# Altium footprint library LimeMicroAltiumLib_pcbLib_r01.PcbLib: 434 footprints (part 11 of 29)
Each footprint in its own frame and in the unit in brackets; x right, y up, seen from the top. Pads: shape width x height; smd on the part's side, far side on the other; paste and mask are expansions set on the pad; w line width, h text height; cw(c..) or ccw(c..) is an arc to the next point about the centre after c.
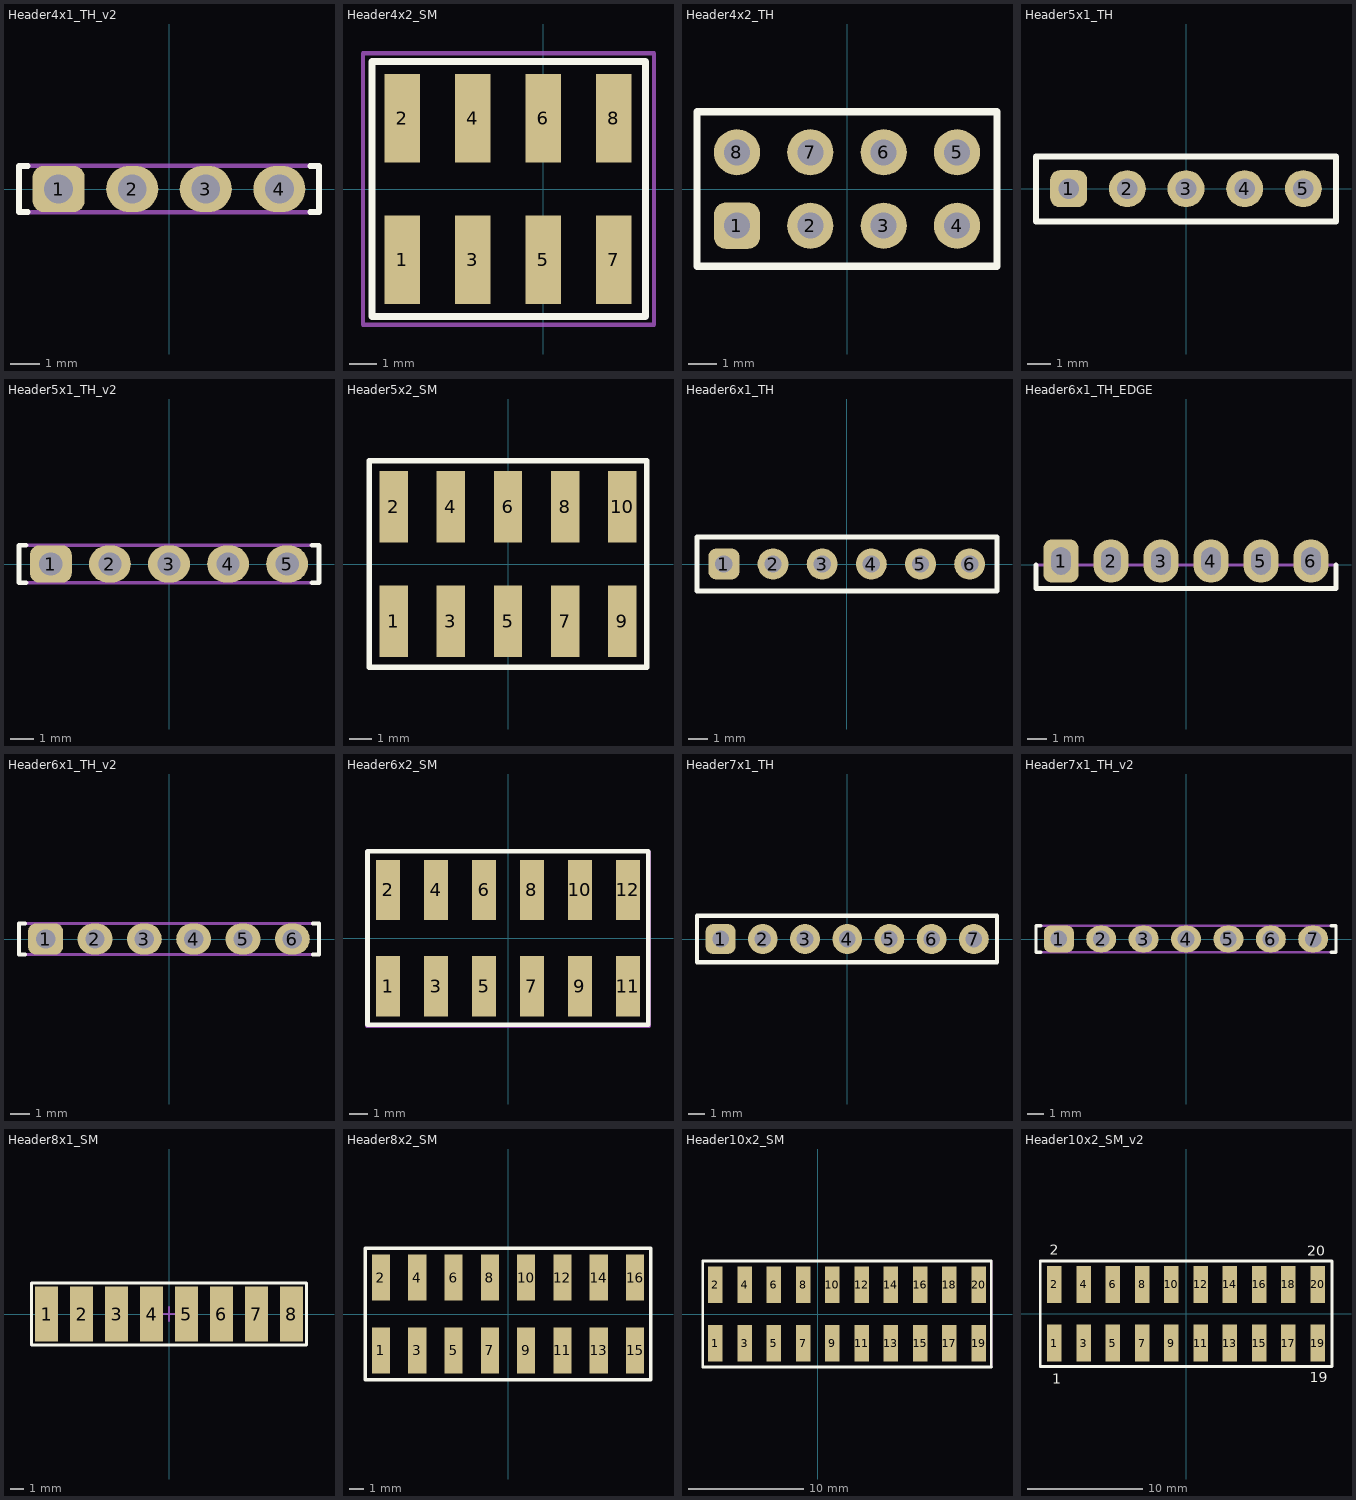
[diagram p10: the footprints below, top view; thin cyan lines are the x and y axes]

## Header4x1_TH_v2 [mm]
pads (4):
  rrect50% 1.8x1.6 hole 1: 1(-3.814,0)
  oval 1.8x1.6 hole 1: 2(-1.271,0) 3(1.271,0) 4(3.814,0)
Top Overlay:
  lines w0.2: -4.886,-0.8 -5.186,-0.8 -5.186,0.8 -4.886,0.8 ; 4.886,-0.8 5.186,-0.8 5.186,0.8 4.886,0.8
Mechanical 15:
  lines w0.15: -5.186,-0.8 -5.186,0.8 5.186,0.8 5.186,-0.8 -5.186,-0.8
  text ".Designator" at -0.025,0 h0.55

## Header4x2_SM [mm]
pads (8):
  rect 1.27x3.2 smd: 1(-5.086,-2.55) 2(-5.086,2.55) 3(-2.543,-2.55) 4(-2.543,2.55) 5(0,-2.55) 6(0,2.55) 7(2.543,-2.55) 8(2.543,2.55)
Top Overlay:
  lines w0.254: -6.186,-4.6 3.7,-4.6 3.7,4.6 -6.186,4.6 -6.186,-4.6
Mechanical 15:
  lines w0.15: -6.5,-4.9 4,-4.9 4,4.9 -6.5,4.9 -6.5,-4.9
  text ".Designator" at -1.4,-0.1 h0.55
3D body "pin_header_a-sl254-dg-g08mp1.stp": height 9.7, standoff -0.04, extent -6.38,-3.75 3.78,3.75

## Header4x2_TH [mm]
pads (8):
  rrect50% 1.6x1.6 hole 0.9: 1(-3.814,-1.271)
  round 1.6 hole 0.9: 2(-1.271,-1.271) 3(1.271,-1.271) 4(3.814,-1.271) 5(3.814,1.271) 6(1.271,1.271) 7(-1.271,1.271) 8(-3.814,1.271)
Top Overlay:
  lines w0.254: -5.2,-2.675 -5.2,2.675 5.2,2.675 5.2,-2.675 -5.2,-2.675
Mechanical 15:
  lines w0.15: -5.2,-2.675 5.2,-2.675 5.2,2.675 -5.2,2.675 -5.2,-2.675
  text ".Designator" at 0,0 h0.55
3D body "65775.stp": height 8.54, standoff -3, extent -5.084,-2.541 -2.544,-0.001
3D body "65775.stp": height 8.54, standoff -3, extent -2.541,-2.541 -0.001,-0.001
3D body "65775.stp": height 8.54, standoff -3, extent 0.001,-2.541 2.541,-0.001
3D body "65775.stp": height 8.54, standoff -3, extent 2.544,-2.541 5.084,-0.001
3D body "65775.stp": height 8.54, standoff -3, extent 2.544,0.002 5.084,2.542
3D body "65775.stp": height 8.54, standoff -3, extent 0.001,0.002 2.541,2.542
3D body "65775.stp": height 8.54, standoff -3, extent -2.541,0.002 -0.001,2.542
3D body "65775.stp": height 8.54, standoff -3, extent -5.084,0.002 -2.544,2.542

## Header5x1_TH [mm]
pads (5):
  rrect50% 1.6x1.6 hole 0.9: 1(-5.086,0)
  round 1.6 hole 0.9: 2(-2.543,0) 3(0,0) 4(2.543,0) 5(5.086,0)
Top Overlay:
  lines w0.254: -6.5,-1.425 -6.5,1.4 6.5,1.4 6.5,-1.425 -6.5,-1.425
Mechanical 15:
  lines w0.15: -6.5,-1.425 6.5,-1.425 6.5,1.4 -6.5,1.4 -6.5,-1.425
  text ".Designator" at 0,0 h0.55
3D body "65775.stp": height 8.54, standoff -3, extent -6.356,-1.27 -3.816,1.27
3D body "65775.stp": height 8.54, standoff -3, extent -3.813,-1.27 -1.273,1.27
3D body "65775.stp": height 8.54, standoff -3, extent -1.27,-1.27 1.27,1.27
3D body "65775.stp": height 8.54, standoff -3, extent 1.273,-1.27 3.813,1.27
3D body "65775.stp": height 8.54, standoff -3, extent 3.816,-1.27 6.356,1.27

## Header5x1_TH_v2 [mm]
pads (5):
  rrect50% 1.8x1.6 hole 1: 1(-5.086,0)
  oval 1.8x1.6 hole 1: 2(-2.543,0) 3(0,0) 4(2.543,0) 5(5.086,0)
Top Overlay:
  lines w0.2: -6.157,-0.8 -6.457,-0.8 -6.457,0.8 -6.157,0.8 ; 6.157,-0.8 6.457,-0.8 6.457,0.8 6.157,0.8
Mechanical 15:
  lines w0.15: -6.457,-0.8 6.457,-0.8 6.457,0.8 -6.457,0.8 -6.457,-0.8
  text ".Designator" at 0,0 h0.55

## Header5x2_SM [mm]
pads (10):
  rect 1.27x3.2 smd: 1(-5.086,-2.55) 2(-5.086,2.55) 3(-2.543,-2.55) 4(-2.543,2.55) 5(0,-2.55) 6(0,2.55) 7(2.543,-2.55) 8(2.543,2.55) 9(5.086,-2.55) 10(5.086,2.55)
Top Overlay:
  lines w0.254: -6.186,-4.6 6.189,-4.6 6.189,4.6 -6.186,4.6 -6.186,-4.6
Mechanical 15:
  lines w0.15: -6.2,-4.6 -6.2,4.6 6.2,4.6 6.2,-4.6 -6.2,-4.6
  text ".Designator" at 0,0 h0.55
3D body "pin_header_a-sl254-dg-g10mp1.stp": height 9.7, standoff -0.04, extent -6.35,-3.75 6.35,3.75

## Header6x1_TH [mm]
pads (6):
  rrect50% 1.6x1.6 hole 0.9: 1(-6.357,0)
  round 1.6 hole 0.9: 2(-3.814,0) 3(-1.271,0) 4(1.271,0) 5(3.814,0) 6(6.357,0)
Top Overlay:
  lines w0.254: -7.75,-1.4 7.775,-1.4 7.775,1.4 -7.75,1.4 -7.75,-1.4
Mechanical 15:
  lines w0.15: -7.75,-1.4 -7.75,1.4 7.775,1.4 7.775,-1.4 -7.75,-1.4
  text ".Designator" at -1.271,0 h0.55
3D body "65775.stp": height 8.54, standoff -3, extent 5.087,-1.27 7.627,1.27
3D body "65775.stp": height 8.54, standoff -3, extent 2.544,-1.27 5.084,1.27
3D body "65775.stp": height 8.54, standoff -3, extent 0.001,-1.27 2.541,1.27
3D body "65775.stp": height 8.54, standoff -3, extent -2.541,-1.27 -0.001,1.27
3D body "65775.stp": height 8.54, standoff -3, extent -5.084,-1.27 -2.544,1.27
3D body "65775.stp": height 8.54, standoff -3, extent -7.627,-1.27 -5.087,1.27

## Header6x1_TH_EDGE [mm]
pads (6):
  rrect50% 1.8x2.2 hole 1 slot 1.4 at 90 deg: 1(-6.357,0.2)
  oval 1.8x2.2 hole 1 slot 1.4 at 90 deg: 2(-3.814,0.2) 3(-1.271,0.2) 4(1.271,0.2) 5(3.814,0.2) 6(6.357,0.2)
Top Overlay:
  lines w0.254: -7.629,0 -7.629,-1.2 7.629,-1.2 7.629,0
Mechanical 15:
  lines w0.15: -7.629,-1.2 -7.629,0 7.629,0 7.629,-1.2 -7.629,-1.2
  text ".Designator" at 0,0 h0.55

## Header6x1_TH_v2 [mm]
pads (6):
  rrect50% 1.8x1.6 hole 1: 1(-6.357,0)
  oval 1.8x1.6 hole 1: 2(-3.814,0) 3(-1.271,0) 4(1.271,0) 5(3.814,0) 6(6.357,0)
Top Overlay:
  lines w0.2: -7.429,-0.8 -7.729,-0.8 -7.729,0.8 -7.429,0.8 ; 7.429,-0.8 7.729,-0.8 7.729,0.8 7.429,0.8
Mechanical 15:
  lines w0.15: -7.729,-0.8 -7.729,0.8 7.729,0.8 7.729,-0.8 -7.729,-0.8
  text ".Designator" at 0,0 h0.55

## Header6x2_SM [mm]
pads (12):
  rect 1.27x3.2 smd: 1(-6.357,-2.55) 2(-6.357,2.55) 3(-3.814,-2.55) 4(-3.814,2.55) 5(-1.271,-2.55) 6(-1.271,2.55) 7(1.271,-2.55) 8(1.271,2.55) 9(3.814,-2.55) 10(3.814,2.55) 11(6.357,-2.55) 12(6.357,2.55)
Top Overlay:
  lines w0.254: -7.457,-4.6 7.443,-4.6 7.443,4.6 -7.457,4.6 -7.457,-4.6
Mechanical 15:
  lines w0.15: -7.5,-4.7 -7.5,4.6 7.5,4.6 7.5,-4.7 -7.5,-4.7
  text ".Designator" at 0,0 h0.55
3D body "pin_header_a-sl254-dg-g12mp1.stp": height 9.7, standoff -0.04, extent -7.62,-3.75 7.62,3.75

## Header7x1_TH [mm]
pads (7):
  rrect50% 1.8x1.8 hole 1: 1(-7.629,0)
  round 1.8 hole 1: 2(-5.086,0) 3(-2.543,0) 4(0,0) 5(2.543,0) 6(5.086,0) 7(7.629,0)
Top Overlay:
  lines w0.254: -9.05,-1.4 9.025,-1.4 9.025,1.4 -9.05,1.4 -9.05,-1.4
Mechanical 15:
  lines w0.15: -9.05,-1.4 -9.05,1.4 9.025,1.4 9.025,-1.4 -9.05,-1.4
  text ".Designator" at 0,0 h0.55
3D body "65775.stp": height 8.54, standoff -3, extent -8.899,-1.27 -6.359,1.27
3D body "65775.stp": height 8.54, standoff -3, extent -6.356,-1.27 -3.816,1.27
3D body "65775.stp": height 8.54, standoff -3, extent -3.813,-1.27 -1.273,1.27
3D body "65775.stp": height 8.54, standoff -3, extent -1.27,-1.27 1.27,1.27
3D body "65775.stp": height 8.54, standoff -3, extent 1.273,-1.27 3.813,1.27
3D body "65775.stp": height 8.54, standoff -3, extent 3.816,-1.27 6.356,1.27
3D body "65775.stp": height 8.54, standoff -3, extent 6.359,-1.27 8.899,1.27

## Header7x1_TH_v2 [mm]
pads (7):
  rrect50% 1.8x1.6 hole 1: 1(-7.629,0)
  oval 1.8x1.6 hole 1: 2(-5.086,0) 3(-2.543,0) 4(0,0) 5(2.543,0) 6(5.086,0) 7(7.629,0)
Top Overlay:
  lines w0.2: -8.7,-0.8 -9,-0.8 -9,0.8 -8.7,0.8 ; 8.7,-0.8 9,-0.8 9,0.8 8.7,0.8
Mechanical 15:
  lines w0.15: -9,-0.8 9,-0.8 9,0.8 -9,0.8 -9,-0.8
  text ".Designator" at 0,0 h0.55

## Header8x1_SM [mm]
pads (8):
  rect 1.7x4 smd: 1(-8.9,0) 2(-6.357,0) 3(-3.814,0) 4(-1.271,0) 5(1.271,0) 6(3.814,0) 7(6.357,0) 8(8.9,0)
Top Overlay:
  lines w0.2: -10,-2.25 -10,2.25 10,2.25 10,-2.25 -10,-2.25
Mechanical 15:
  lines w0.15: -0.5,0 0,0 ; 0,-0.5 0,0 ; 0,0.5 0,0 ; 0.5,0 0,0 ; -10.014,-2.25 10,-2.25 10,2.25 -10.014,2.25 -10.014,-2.25
  text ".Designator" at 0,0 h0.55

## Header8x2_SM [mm]
pads (16):
  rect 1.27x3.2 smd: 1(-8.9,-2.55) 2(-8.9,2.55) 3(-6.357,-2.55) 4(-6.357,2.55) 5(-3.814,-2.55) 6(-3.814,2.55) 7(-1.271,-2.55) 8(-1.271,2.55) 9(1.271,-2.55) 10(1.271,2.55) 11(3.814,-2.55) 12(3.814,2.55) 13(6.357,-2.55) 14(6.357,2.55) 15(8.9,-2.55) 16(8.9,2.55)
Top Overlay:
  lines w0.254: -10,-4.6 10,-4.6 10,4.6 -10,4.6 -10,-4.6
Mechanical 15:
  lines w0.15: -10,-4.6 -10,4.6 10,4.6 10,-4.6 -10,-4.6
  text ".Designator" at 0,0 h0.55
3D body "pin_header_a-sl254-dg-g08mp1.stp": height 9.7, standoff -0.04, extent -10.18,-3.95 -0.02,3.55
3D body "pin_header_a-sl254-dg-g08mp1.stp": height 9.7, standoff -0.04, extent -0.02,-3.95 10.14,3.55

## Header10x2_SM [mm] "JTAG"
pads (20):
  rect 1.27x3.2 smd: 1(-8.9,-2.55) 2(-8.9,2.55) 3(-6.357,-2.55) 4(-6.357,2.55) 5(-3.814,-2.55) 6(-3.814,2.55) 7(-1.271,-2.55) 8(-1.271,2.55) 9(1.271,-2.55) 10(1.271,2.55) 11(3.814,-2.55) 12(3.814,2.55) 13(6.357,-2.55) 14(6.357,2.55) 15(8.9,-2.55) 16(8.9,2.55) 17(11.443,-2.55) 18(11.443,2.55) 19(13.986,-2.55) 20(13.986,2.55)
Top Overlay:
  lines w0.254: 15.086,-4.6 15.086,4.6 -10,4.6 -10,-4.6 15.1,-4.6
Mechanical 15:
  lines w0.15: -10,-4.6 15.1,-4.6 15.1,4.6 -10,4.6 -10,-4.6
  text ".Designator" at 0,0 h0.55
3D body "pin_header_a-sl254-dg-g20mp1.stp": height 9.7, standoff -0.04, extent -10.2,-3.75 15.2,3.75

## Header10x2_SM_v2 [mm]
pads (20):
  rect 1.27x3.2 smd: 1(-11.443,-2.55) 2(-11.443,2.55) 3(-8.9,-2.55) 4(-8.9,2.55) 5(-6.357,-2.55) 6(-6.357,2.55) 7(-3.814,-2.55) 8(-3.814,2.55) 9(-1.271,-2.55) 10(-1.271,2.55) 11(1.271,-2.55) 12(1.271,2.55) 13(3.814,-2.55) 14(3.814,2.55) 15(6.357,-2.55) 16(6.357,2.55) 17(8.9,-2.55) 18(8.9,2.55) 19(11.443,-2.55) 20(11.443,2.55)
Top Overlay:
  lines w0.254: -12.675,-4.6 -12.675,4.6 12.707,4.6 12.707,-4.6 -12.675,-4.6
  text "19" at 10.75,-5.975 h0.9
  text "20" at 10.525,5.05 h0.9
  text "2" at -11.843,5.125 h0.9
  text "1" at -11.643,-6.075 h0.9
Mechanical 15:
  lines w0.15: -12.675,-4.6 12.707,-4.6 12.707,4.6 -12.675,4.6 -12.675,-4.6
  text ".Designator" at -0.175,0 h0.55
3D body "pin_header_a-sl254-dg-g20mp1.stp": height 9.7, standoff -0.04, extent -12.7,-3.75 12.7,3.75